# Altium footprint library WE-CNSW-1206.PcbLib: 1 footprints
Each footprint in its own frame and in the unit in brackets; x right, y up, seen from the top. Pads: shape width x height; smd on the part's side, far side on the other; paste and mask are expansions set on the pad; w line width, h text height; cw(c..) or ccw(c..) is an arc to the next point about the centre after c.
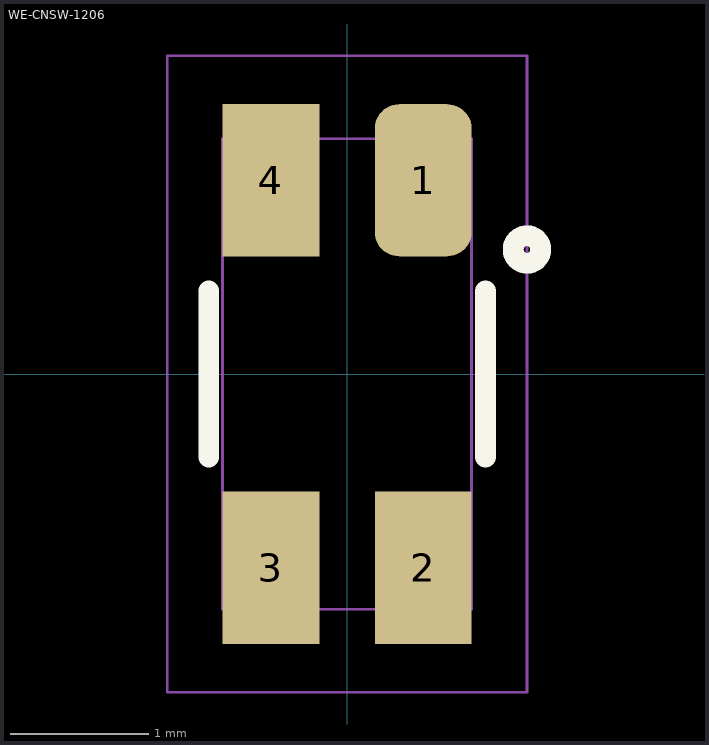
[diagram p0: the footprint, top view; thin cyan lines are the x and y axes]

## WE-CNSW-1206 [mm] "Self SMD 4 pins Boitier WE-CNSW 1206"
height 2.1
pads (4):
  rrect50% 0.7x1.1 smd paste+0 mask+0.075: 1(0.55,1.4)
  rect 0.7x1.1 smd paste+0 mask+0.075: 2(0.55,-1.4) 3(-0.55,-1.4) 4(-0.55,1.4)
Top Overlay:
  circle w0.15: c1.3,0.9 r0.1
  lines w0.15: -1,-0.6 -1,0.6 ; 1,-0.6 1,0.6
Mechanical 9:
  text "'.PN'" at 0.292,-0.916 h0.5
Mechanical 15:
  lines w0.02: -1.3,-2.3 1.3,-2.3 1.3,2.3 -1.3,2.3 -1.3,-2.3
Mechanical 17:
  circle w0.15: c0.525,1.2 r0.175
  lines w0.02: -0.9,-1.7 -0.9,1.7 0.9,1.7 0.9,-1.7 -0.9,-1.7
Mechanical 19:
  lines w0.02: -0.9,-1.7 -0.3,-1.7 -0.3,-1.1 -0.9,-1.1 -0.9,-1.7 ; -0.9,1.1 -0.9,1.7 -0.3,1.7 -0.3,1.1 -0.9,1.1 ; 0.3,-1.7 0.3,-1.1 0.9,-1.1 0.9,-1.7 0.3,-1.7 ; 0.3,1.1 0.3,1.7 0.9,1.7 0.9,1.1 0.3,1.1
3D body: height 2.1, standoff 1.5, extent -1,-1.8 1,1.8
3D body: height 1.5, standoff 0.1, extent -0.9,-1.7 -0.3,-1.1
3D body: height 1.5, standoff 0.1, extent 0.3,-1.7 0.9,-1.1
3D body: height 1.5, standoff 0.1, extent -0.9,1.1 -0.3,1.7
3D body: height 1.5, standoff 0.1, extent 0.3,1.1 0.9,1.7
3D body: height 0.1, standoff 0, extent -0.9,1.1 -0.3,1.7
3D body: height 0.1, standoff 0, extent 0.3,1.1 0.9,1.7
3D body: height 0.1, standoff 0, extent -0.9,-1.7 -0.3,-1.1
3D body: height 0.1, standoff 0, extent 0.3,-1.7 0.9,-1.1
3D body: height 1.5, standoff 0.5, extent -0.9,-1.7 0.9,1.7
3D body: height 0.5, standoff 0.4, extent -0.9,0 0.9,0.6
3D body: height 0.5, standoff 0.4, extent -0.9,-0.6 0.9,0
3D body: height 1.5, standoff 0.4, extent 0.9,0.4 1,0.6
3D body: height 1.5, standoff 0.4, extent 0.9,-0.2 1,0
3D body: height 1.5, standoff 0.4, extent -1,0 -0.9,0.2
3D body: height 1.5, standoff 0.4, extent -1,-0.6 -0.9,-0.4